# Altium footprint library lib_protel_HC.PCBLIB: 724 footprints (part 35 of 46)
Each footprint in its own frame and in the unit in brackets; x right, y up, seen from the top. Pads: shape width x height; smd on the part's side, far side on the other; paste and mask are expansions set on the pad; w line width, h text height; cw(c..) or ccw(c..) is an arc to the next point about the centre after c.
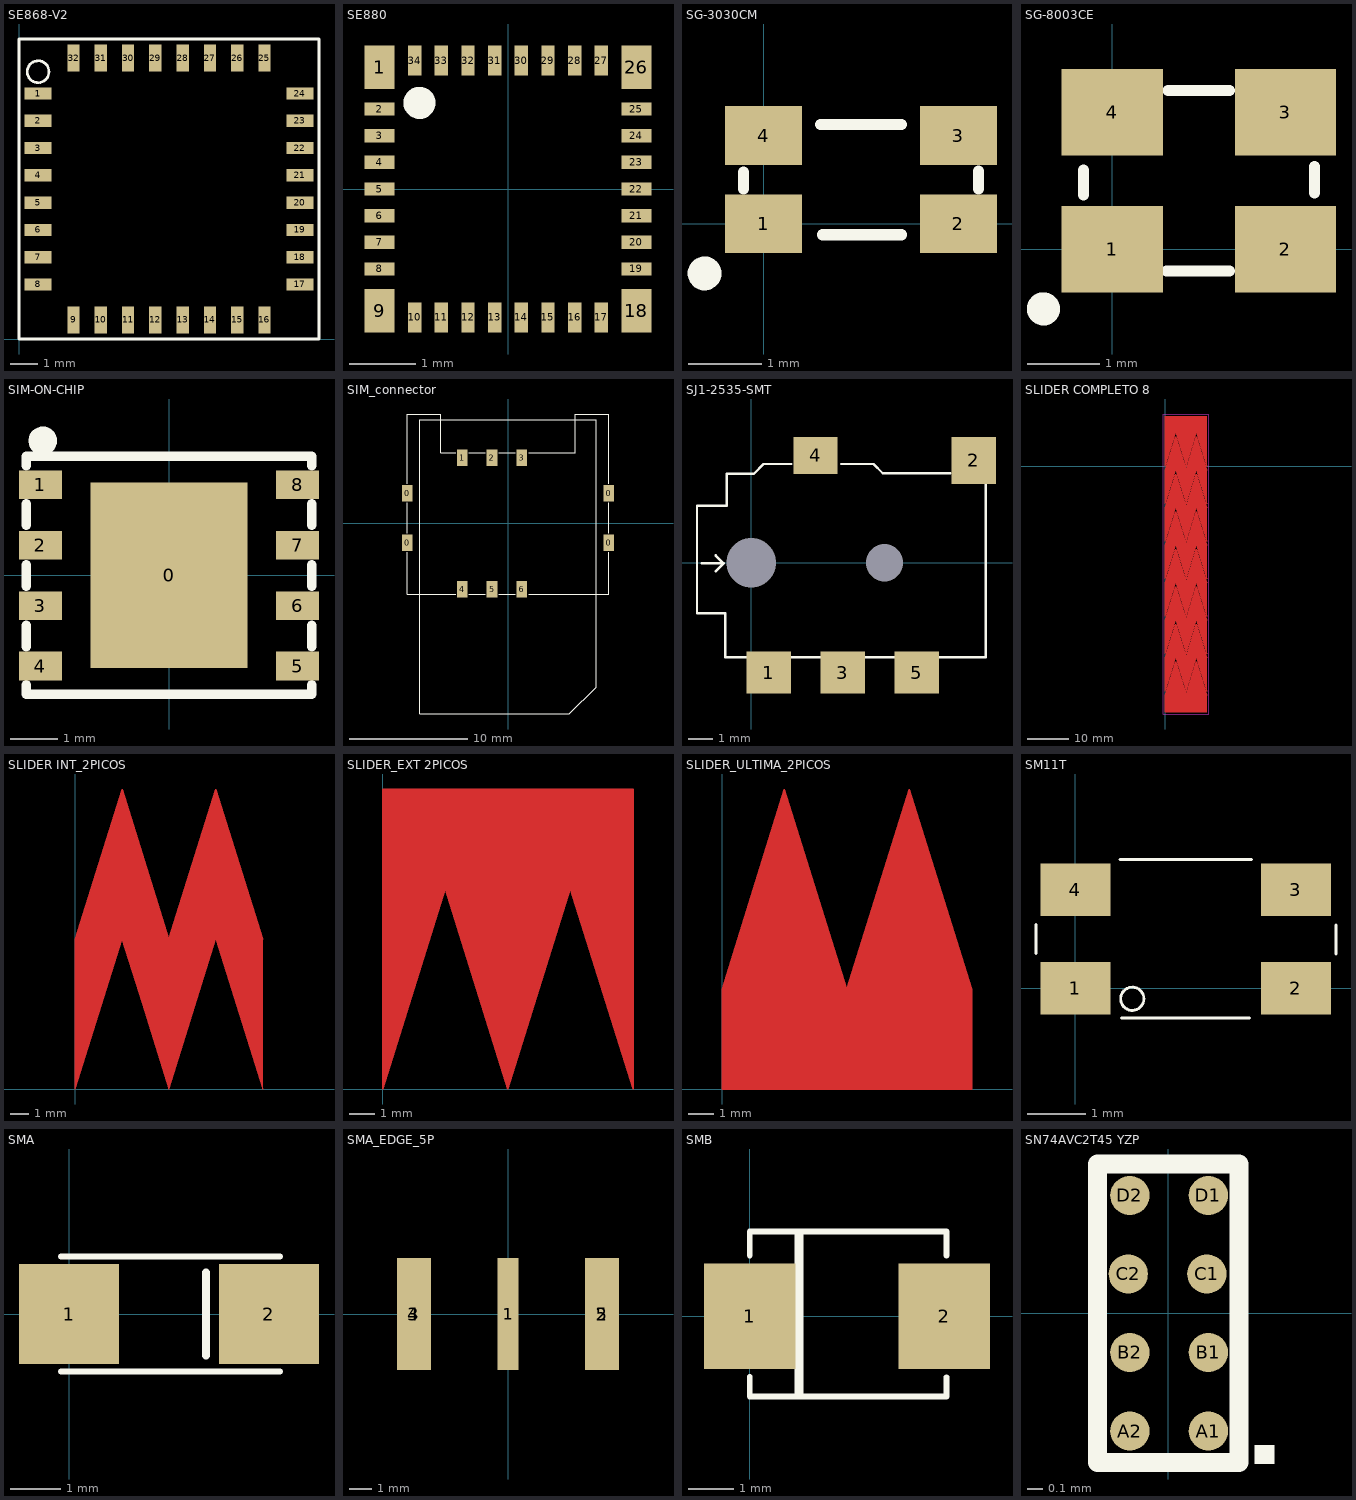
[diagram p34: the footprints below, top view; thin cyan lines are the x and y axes]

## SE868-V2 [mm] "GPS TELIT SE868-V2"
height 2.6
pads (32):
  rect 1x0.45 smd mask+0.05: 1(0.7,9) 2(0.7,8) 3(0.7,7) 4(0.7,6) 5(0.7,5) 6(0.7,4) 7(0.7,3) 8(0.7,2) 17(10.3,2) 18(10.3,3) 19(10.3,4) 20(10.3,5) 21(10.3,6) 22(10.3,7) 23(10.3,8) 24(10.3,9)
  rect 0.45x1 smd mask+0.05: 9(2,0.7) 10(3,0.7) 11(4,0.7) 12(5,0.7) 13(6,0.7) 14(7,0.7) 15(8,0.7) 16(9,0.7) 25(9,10.3) 26(8,10.3) 27(7,10.3) 28(6,10.3) 29(5,10.3) 30(4,10.3) 31(3,10.3) 32(2,10.3)
Top Overlay:
  circle w0.1: c0.7,9.8 r0.4
  lines w0.1: 0,0 11,0 11,11 0,11 0,0
3D body: height 6.4, standoff 2.08, extent 0.92,0.92 10.08,10.08
3D body: height 2.08, standoff 0, extent 0,0 11,11

## SE880 [mm] "GPS Telit SE880"
height 1.4
pads (34):
  rect 0.45x0.65 smd mask+0.05: 1(-1.925,1.825) 9(-1.925,-1.825) 18(1.925,-1.825) 26(1.925,1.825)
  rect 0.45x0.2 smd mask+0.05: 2(-1.925,1.2) 3(-1.925,0.8) 4(-1.925,0.4) 5(-1.925,0) 6(-1.925,-0.4) 7(-1.925,-0.8) 8(-1.925,-1.2) 19(1.925,-1.2) 20(1.925,-0.8) 21(1.925,-0.4) 22(1.925,0) 23(1.925,0.4) 24(1.925,0.8) 25(1.925,1.2)
  rect 0.2x0.45 smd mask+0.05: 10(-1.4,-1.925) 11(-1,-1.925) 12(-0.6,-1.925) 13(-0.2,-1.925) 14(0.2,-1.925) 15(0.6,-1.925) 16(1,-1.925) 17(1.4,-1.925) 27(1.4,1.925) 28(1,1.925) 29(0.6,1.925) 30(0.2,1.925) 31(-0.2,1.925) 32(-0.6,1.925) 33(-1,1.925) 34(-1.4,1.925)
Top Overlay:
  circle w0.254: c-1.327,1.292 r0.114
3D body: height 1.4, standoff 0, extent -2.35,-2.35 2.35,2.35

## SG-3030CM [mm] "RELOJ SG-3030CM"
height 0.9
pads (4):
  rect 1.05x0.8 smd: 1(0,0) 2(2.65,0) 3(2.65,1.2) 4(0,1.2)
Top Overlay:
  circle w0.254: c-0.803,-0.675 r0.103
  lines w0.152: -0.275,0.475 -0.275,0.7 ; 0.775,1.35 1.875,1.35 ; 0.8,-0.15 1.875,-0.15 ; 2.925,0.475 2.925,0.72
3D body "User Library-GeyerElectronics_KX6.step": height 0.56, standoff 0, extent 0.04,-0.4 2.56,1.6

## SG-8003CE [mm] "RELOJ SG-8003CE"
height 1.05
pads (4):
  rect 1.4x1.2 smd: 1(0,0) 2(2.4,0) 3(2.4,1.9) 4(0,1.9)
Top Overlay:
  circle w0.254: c-0.953,-0.825 r0.103
  lines w0.152: -0.4,0.75 -0.4,1.1 ; 0.75,-0.3 1.625,-0.3 ; 0.775,2.2 1.625,2.2 ; 2.8,0.78 2.8,1.15
3D body "User Library-GeyerElectronics_KX6.step": height 0.56, standoff 0, extent -0.135,-0.05 2.385,1.95

## SIM-ON-CHIP [mm]
height 0.9
pads (9):
  rect 3.3x3.9 smd: 0(0,0)
  rect 0.9x0.6 smd: 1(-2.7,1.905) 2(-2.7,0.635) 3(-2.7,-0.635) 4(-2.7,-1.905) 5(2.7,-1.905) 6(2.7,-0.635) 7(2.7,0.635) 8(2.7,1.905)
Top Overlay:
  circle w0.3: c-2.65,2.825 r0.15
  lines w0.2: -3,-2.3 -3,-2.5 3,-2.5 3,-2.3 ; -3,-1.5 -3,-1.05 ; -3,-0.225 -3,0.225 ; -3,1.05 -3,1.5 ; -3,2.3 -3,2.5 3,2.5 3,2.3 ; 3,-1.5 3,-1.05 ; 3,-0.225 3,0.225 ; 3,1.05 3,1.5
3D body "User Library-VQFN-8.STEP": height 0.9, standoff 0, extent -3,-2.5 3,2.5

## SIM_connector [mm]
pads (10):
  rect 0.9x1.4 smd: 0(-8.55,-1.65) 0(-8.55,2.55) 0(8.55,-1.65) 0(8.55,2.55) 1(-3.9,5.6) 2(-1.36,5.6) 3(1.18,5.6) 4(-3.9,-5.6) 5(-1.36,-5.6) 6(1.18,-5.6)
Top Overlay:
  lines w0.1: -8.55,-2.45 -8.55,-6.025 -4.45,-6.025 ; -8.55,-0.85 -8.55,1.75 ; -8.55,3.35 -8.55,9.3 -5.7,9.3 -5.7,6 -4.45,6 ; -3.35,-6.025 -1.925,-6.025 ; -3.35,6 -1.925,6 ; -0.8,-6.025 0,-6.025 0.625,-6.025 ; -0.8,6 0,6 ; -0.025,6 0.6,6 ; 1.75,-6.025 8.575,-6.025 8.575,-2.45 ; 1.75,6 5.725,6 5.725,9.3 8.575,9.3 8.575,3.35 ; 8.575,-0.85 8.575,1.75 ; -7.5,-16.2 5.225,-16.2 7.5,-13.925 7.5,8.8 -7.5,8.8 -7.5,-16.2

## SJ1-2535-SMT [mm] "CONECTOR JACK AUDIO STEREO"
height 3.1
pads (7):
  round 0 hole 2: 0(0,0)
  round 0 hole 1.5: 0(5.4,0)
  rect 1.8x1.7 smd: 1(0.7,-4.45) 3(3.7,-4.45) 5(6.7,-4.45)
  rect 1.8x1.9 smd: 2(9,4.15)
  rect 1.8x1.5 smd: 4(2.6,4.35)
Top Overlay:
  lines w0.1: -2,-0.025 -1.125,-0.025 ; -1.45,-0.35 -1.125,-0.025 ; -1.45,0.3 -1.125,-0.025 ; 1.625,4 0.5,4 0.1,3.6 -1,3.6 -1,2.3 -2.2,2.3 -2.2,-2.05 -1.05,-2.05 -1.05,-3.825 ; 3.65,4 4.95,4 5.325,3.625 8.05,3.625 ; 9.5,3.175 9.5,-3.825 -1.05,-3.825 ; -1.125,-0.025 -1.125,-0.025 ; -1.05,-3.825 -1.05,-3.825

## SLIDER COMPLETO 8 [mm]
Top Layer:
  rectangle: 0,7.976 10.008,11.989
  region: 0,-59 0,-54.987 10.008,-54.987 10.008,-59
  region: 2.515,-47.011 2.515,-55.012 0,-55.012
  region: 2.489,-47.011 2.489,-55.012 5.004,-55.012
  region: 7.493,-46.986 7.493,-55.012 5.004,-55.012
  region: 7.493,-46.986 7.493,-55.012 10.008,-55.012
  region: 7.493,-45.999 10.008,-45.999 10.008,-53.975
  region: 7.493,-45.999 5.004,-45.999 5.004,-53.975
  region: 2.489,-45.999 5.004,-45.999 5.004,-53.975
  region: 2.489,-45.999 0,-45.999 0,-53.975
  region: 2.489,-37.998 2.489,-46.024 0,-46.024
  region: 2.489,-38.023 2.489,-46.024 5.004,-46.024
  region: 7.493,-37.998 7.493,-46.024 5.004,-46.024
  region: 7.493,-37.998 7.493,-46.024 10.008,-46.024
  region: 7.493,-36.999 10.008,-36.999 10.008,-44.975
  region: 7.493,-36.999 5.004,-36.999 5.004,-44.975
  region: 2.489,-36.999 5.004,-36.999 5.004,-44.975
  region: 2.489,-36.999 0,-36.999 0,-44.975
  region: 2.489,-28.998 2.489,-37.024 0,-37.024
  region: 2.489,-29.023 2.489,-37.024 5.004,-37.024
  region: 7.493,-28.998 7.493,-37.024 5.004,-37.024
  region: 7.493,-28.998 7.493,-37.024 10.008,-37.024
  region: 7.493,-27.999 10.008,-27.999 10.008,-35.975
  region: 7.493,-27.999 5.004,-27.999 5.004,-35.975
  region: 2.489,-27.999 5.004,-27.999 5.004,-35.975
  region: 2.489,-27.999 0,-27.999 0,-35.975
  region: 2.489,-19.998 2.489,-28.024 0,-28.024
  region: 2.489,-20.023 2.489,-28.024 5.004,-28.024
  region: 7.493,-19.998 7.493,-28.024 5.004,-28.024
  region: 7.493,-19.998 7.493,-28.024 10.008,-28.024
  region: 7.493,-18.999 10.008,-18.999 10.008,-26.975
  region: 7.493,-18.999 5.004,-18.999 5.004,-26.975
  region: 2.489,-18.999 5.004,-18.999 5.004,-26.975
  region: 2.489,-18.999 0,-18.999 0,-26.975
  region: 2.489,-10.998 2.489,-19.024 0,-19.024
  region: 2.489,-11.023 2.489,-19.024 5.004,-19.024
  region: 7.493,-10.998 7.493,-19.024 5.004,-19.024
  region: 7.493,-10.998 7.493,-19.024 10.008,-19.024
  region: 7.493,-9.999 10.008,-9.999 10.008,-17.975
  region: 7.493,-9.999 5.004,-9.999 5.004,-17.975
  region: 2.489,-9.999 5.004,-9.999 5.004,-17.975
  region: 2.489,-9.999 0,-9.999 0,-17.975
  region: 2.489,-1.998 2.489,-10.024 0,-10.024
  region: 2.489,-2.023 2.489,-10.024 5.004,-10.024
  region: 7.493,-1.998 7.493,-10.024 5.004,-10.024
  region: 7.493,-1.998 7.493,-10.024 10.008,-10.024
  region: 7.493,-0.999 10.008,-0.999 10.008,-8.975
  region: 7.493,-0.999 5.004,-0.999 5.004,-8.975
  region: 2.489,-0.999 5.004,-0.999 5.004,-8.975
  region: 2.489,-0.999 0,-0.999 0,-8.975
  region: 2.489,7.002 2.489,-1.024 0,-1.024
  region: 2.489,6.977 2.489,-1.024 5.004,-1.024
  region: 7.493,7.002 7.493,-1.024 5.004,-1.024
  region: 7.493,7.002 7.493,-1.024 10.008,-1.024
  region: 0,0.051 0,8.001 2.489,8.001
  region: 5.004,0.025 5.004,8.001 7.493,8.001
  region: 5.004,0.025 5.004,8.001 2.515,8.001
  region: 10.008,0.025 10.008,8.001 9.982,8.026 7.493,8.026
  lines w0.051: 0,-37 2.5,-29 5,-37 7.5,-29 10,-37 10,-45 7.5,-37 5,-45 2.5,-37 0,-45 0,-36.999 ; 0,-28 2.5,-20 5,-28 7.5,-20 10,-28 10,-36 7.5,-28 5,-36 2.5,-28 0,-36 0,-27.999 ; 0,-19 2.5,-11 5,-19 7.5,-11 10,-19 10,-27 7.5,-19 5,-27 2.5,-19 0,-27 0,-18.999 ; 0,-10 2.5,-2 5,-10 7.5,-2 10,-10 10,-18 7.5,-10 5,-18 2.5,-10 0,-18 0,-9.999 ; 10,0 7.5,8 5,0 2.5,8 0,0 0,11.989 10.008,11.989 10.008,0 ; 0,-59 10,-59 10,-55 7.5,-47 5,-55 2.5,-47 0,-55 0,-59 ; 0,-54 0,-45.999 2.5,-38 5,-46 7.5,-38 10,-46 10,-54 7.5,-46 5,-54 2.5,-46 0,-54 ; 0,-9 0,-0.999 2.5,7 5,-1 7.5,7 10,-1 10,-9 7.5,-1 5,-9 2.5,-1 0,-9
Keep-Out Layer:
  lines w0.254: -0.5,-59.5 -0.5,12.5 10.5,12.5 10.5,-59.5 -0.5,-59.5

## SLIDER INT_2PICOS [mm] "SLIDER INTERNO 10mm"
Top Layer:
  region: 7.493,8.001 10.008,8.001 10.008,0.025
  region: 7.493,8.001 5.004,8.001 5.004,0.025
  region: 2.489,8.001 5.004,8.001 5.004,0.025
  region: 2.489,8.001 0,8.001 0,0.025
  region: 2.489,16.002 2.489,7.976 0,7.976
  region: 2.489,15.977 2.489,7.976 5.004,7.976
  region: 7.493,16.002 7.493,7.976 5.004,7.976
  region: 7.493,16.002 7.493,7.976 10.008,7.976
  lines w0.051: 0,8 2.5,16 5,8 7.5,16 10,8 10,0 7.5,8 5,0 2.5,8 0,0 0,8.001

## SLIDER_EXT 2PICOS [mm] "COMIENZO SLIDER DE 10mm"
Top Layer:
  rectangle: 0,7.976 10.008,11.989
  region: 0,0.051 0,8.001 2.489,8.001
  region: 5.004,0.025 5.004,8.001 7.493,8.001
  region: 5.004,0.025 5.004,8.001 2.515,8.001
  region: 10.008,0.025 10.008,8.001 9.982,8.026 7.493,8.026
  lines w0.051: 10,0 7.5,8 5,0 2.5,8 0,0 0,11.989 10.008,11.989 10.008,0

## SLIDER_ULTIMA_2PICOS [mm] "SLIDER ULTIMA PIEZA 10mm"
Top Layer:
  region: 7.493,12.014 7.493,3.988 10.008,3.988
  region: 7.493,12.014 7.493,3.988 5.004,3.988
  region: 2.489,11.989 2.489,3.988 5.004,3.988
  region: 2.515,11.989 2.515,3.988 0,3.988
  region: 0,0 0,4.013 10.008,4.013 10.008,0
  lines w0.051: 0,0 0,4 2.5,12 5,4 7.5,12 10,4 10,0 0,0

## SM11T [mm] "crystal de 25MHZ SMD"
height 0.85
pads (4):
  rect 1.2x0.9 smd: 1(0,0) 2(3.8,0) 3(3.8,1.7) 4(0,1.7)
Top Overlay:
  circle w0.051: c0.98,-0.18 r0.2
  lines w0.051: -0.68,0.6 -0.68,1.1 ; 0.77,2.22 3.03,2.22 ; 0.79,-0.51 3,-0.51 ; 4.49,0.59 4.49,1.09

## SMA [mm]
height 1.91
pads (2):
  rect 2x2 smd: 1(0,0) 2(4,0)
Top Overlay:
  lines w0.127: -0.16,-1.15 4.22,-1.15 ; -0.16,1.15 4.22,1.15
  lines w0.152: 2.74,-0.83 2.74,0.83

## SMA_EDGE_5P [mm] "SMA Edge connector 5 P"
height 4
pads (5):
  rect 0.95x5 smd: 1(0,0)
  rect 1.5x5 smd: 2(4.2,0) 3(-4.2,0)
  rect 1.5x5 smd far side: 4(-4.2,0) 5(4.2,0)

## SMB [mm]
pads (2):
  rect 2x2.3 smd: 1(0,0) 2(4.25,0)
Top Overlay:
  lines w0.127: 0,-1.32 0,-1.75 4.3,-1.75 4.3,-1.33 ; 0,1.33 0,1.85 4.3,1.85 4.3,1.33
  lines w0.2: 1.08,-1.66 1.08,1.79

## SN74AVC2T45 YZP [mm] "SN74AVC2T45"
height 0.5
pads (8):
  round 0.25 smd mask+0.025: A1(0.255,-0.75) A2(-0.245,-0.75) B1(0.255,-0.25) B2(-0.245,-0.25) C1(0.245,0.25) C2(-0.255,0.25) D1(0.255,0.75) D2(-0.245,0.75)
Top Overlay:
  rectangle: 0.55,-0.96 0.675,-0.84
  lines w0.12: -0.45,-0.95 -0.45,0.95 0.45,0.95 0.45,-0.95 -0.45,-0.95